# Altium schematic symbol library TI Amplifiers and Linear Special Function Amplifier.SchLib: 708 symbols (part 18 of 34) (continued)
## TAS5716PAPR (continued)
part B pins: 2 PGND_B (power) "Power ground for half-bridge B", 3 PGND_B (power) "Power ground for half-bridge B", 6 PGND_A (power) "Power ground for half-bridge A", 7 PGND_A (power) "Power ground for half-bridge A", 8 PVCC_A (power) "Power supply input for half-bridge output A", 9 PVCC_A (power) "Power supply input for half-bridge output A", 10 AVDD (power) "3.3-V analog power supply", 11 AVSS (power) "analog 3.3-V supply ground", 14 VR_ANA (power) "Internally regulated 1.8-V analog supply voltage. This terminal must not be used to power external devices.", 15 DVDD (power) "3.3-V digital power supply", 20 DVSS (power) "Digital ground", 26 DVSS (power) "Digital ground", 27 VR_DIG (power) "Internally regulated 1.8-V digital supply voltage. This terminal must not be used to power external devices.", 33 DVDD (power) "3.3-V digital power supply", 41 PVCC_D (power) "Power supply input for half-bridge output D", 42 PVCC_D (power) "Power supply input for half-bridge output D", 43 PGND_D (power) "Power ground for half-bridge D", 44 PGND_D (power) "Power ground for half-bridge D", 47 PGND_C (power) "Power ground for half-bridge C", 48 PGND_C (power) "Power ground for half-bridge C", 51 PVCC_C (power) "Power supply input for half-bridge output C", 52 PVCC_C (power) "Power supply input for half-bridge output C", 57 AGND (power) "Analog ground for power stage", 58 AVCC (power) "Analog power supply for power stage. Connect externally to same potential as PVCC.", 62 PVCC_B (power) "Power supply input for half-bridge output B", 63 PVCC_B (power) "Power supply input for half-bridge output B", 65 EP

## TAS5717PHP
designator U?
Digital Input Stereo Amplifier with Integrated CAP Free Headphone Amplifier, 0 to 85 degC, 48-pin QFP (PHP48), Green (RoHS & no Sb/Br); Manufacturer: Texas Instruments; PartNumber: TAS5717PHP; Analog Supply Max [V]: 3.6; Analog Supply Min [V]: 3; Max. Number of Speaker Outputs: 2; Power Stage Supply Min(V): 4.5; SubFamily: Mid/High-Power Amplifier; DatasheetVersion: SLOS655A; PackageVersion: 4146927/B, 08/2003; PackageReference: PHP48-4550X3600TP; PackageDescription: 48-Pin PowerPAD(TM) Plastic Quad Flatpack, Body 7 x 7 mm, Pitch 0.5 mm; Supplier 1: Digi-Key; Supplier Part Number 1: TAS5717PHP-ND; Supplier 2: Farnell; Supplier Part Number 2: 1855119; Supplier 3: Newark; Supplier Part Number 3: 23T1393; Supplier 4: Newark; Supplier Part Number 4: 21T4067; Supplier 5: Mouser; Supplier Part Number 5: 595-TAS5717PHP; Digital Supply Min [V]: 3; Eco-Plan: Green (RoHS & no Sb/Br); Input Type: Digital; Mounting Technology: Surface Mount; Code_JEDEC: MS-026; ComponentLink1Description: Manufacturer URL; ComponentLink1URL: http://www.ti.com/; ComponentLink2Description: Datasheet; ComponentLink2URL: http://www.ti.com/general/docs/lit/getliterature.tsp?genericPartNumber=TAS5717&fileType=pdf; ComponentLink3Description: Package Specification; ComponentLink3URL: http://www.ti.com/litv/pdf/mpdi001b
footprint TI-PHP48-4550X3600TP_N (QFP, 48-Leads, Body 7x7mm, Pitch 0.5mm, Thermal Pad 5.17x4.04mm, IPC Medium Density)
footprint TI-PHP48-4550X3600TP_L (QFP, 48-Leads, Body 7x7mm, Pitch 0.5mm, Thermal Pad 5.17x4.04mm, IPC High Density)
footprint TI-PHP48-4550X3600TP_M (QFP, 48-Leads, Body 7x7mm, Pitch 0.5mm, Thermal Pad 5.17x4.04mm, IPC Low Density)
part A pins: 1 HPR_IN (in) "Headphone left IN (single-ended, analog IN)", 2 HPL_OUT (out) "Headphone left OUT (single-ended, analog OUT)", 3 HPR_OUT (out) "Headphone right OUT (single-ended, analog OUT)", 4 HPL_IN (in) "Headphone right IN (single-ended, analog IN)", 6 CPN "Charge-pump flying-capacitor negative connection", 7 CPP "Charge-pump flying-capacitor positive connection", 10 PLL_FLTM "PLL negative loop-filter terminal", 11 PLL_FLTP "PLL positive loop-filter terminal", 14 ~{A_SEL} (io) "This pin is monitored on the rising edge of RESET. A value of 0 makes the I2C dev address 0x54, and a value of 1 makes it 0x56.", 15 MCLK (in) "Master clock input", 16 OSC_RES "Oscillator trim resistor. Connect an 18-kO 1% resistor to DVSSO.", 19 ~{PDN} (in) "Power down, active-low. P\D\N\ prepares the device for loss of power supplies by shutting down the noise shaper and initiating the PWM stop sequence.", 20 LRCLK (in) "Input serial audio data left/right clock (sample rate clock)", 21 SCLK (in) "Serial audio data clock (shift clock). SCLK is the serial audio port input data bit clock.", 22 SDIN (in) "Serial audio data input. SDIN supports three discrete (stereo) data formats.", 23 SDA (io) "I2C serial control data interface input/output", 24 SCL (in) "I2C serial control clock input", 25 ~{RESET} (in) "Reset, active-low. A system reset is generated by applying a logic low to this pin. R\E\S\E\T\ is an asynchronous control signal that restores the DAP to its default conditions, and places the PWM in the hard-mute (See Datasheet)", 26 STEST (in) "Factory test pin. Connect directly to DVSS.", 31 VREG "Digital regulator output. Not to be used for powering external circuitry.", 32 SSTIMER (in) "Controls ramp time of OUT_X to minimize pop. Leave this pin floating for BD mode. Requires capacitor of 2.2 nF to GND in AD mode. The capacitor determines the ramp time.", 33 ~{HP_SD} (in) "Headphone shutdown (active-low)", 36 BST_D "High-side bootstrap supply for half-bridge D", 37 OUT_D (hiz) "Output, half-bridge D", 39 OUT_C (hiz) "Output, half-bridge C", 40 BST_C "High-side bootstrap supply for half-bridge C", 41 BST_B "High-side bootstrap supply for half-bridge B", 42 OUT_B (hiz) "Output, half-bridge B", 44 OUT_A (hiz) "Output, half-bridge A", 45 BST_A "High-side bootstrap supply for half-bridge A", 47 HP_PWMR (hiz) "PWM right-channel headphone out", 48 HP_PWML (hiz) "PWM left-channel headphone out"
part B pins: 5 HPVSS (power) "Headphone ground", 8 HPVDD (power) "Headphone supply", 9 AVSS (power) "Analog 3.3-V supply ground", 12 VR_ANA (power) "Internally regulated 1.8-V analog supply voltage. This pin must not be used to power external devices.", 13 AVDD (power) "3.3-V analog power supply", 17 DVSSO (power) "Oscillator ground", 18 VR_DIG (power) "Internally regulated 1.8-V digital supply voltage. This pin must not be used to power external devices.", 27 DVDD (power) "3.3-V digital power supply", 28 DVSS (power) "Digital ground", 29 GND (power) "Analog ground for power stage", 30 AGND (power) "Analog ground for power stage", 34 GVDD_OUT (power) "Gate drive internal regulator output", 35 PVDD_CD (power) "Power-supply input for half-bridge output C", 38 PGND_CD (power) "Power ground for half-bridges C and D", 43 PGND_AB (power) "Power ground for half-bridges A and B", 46 PVDD_AB (power) "Power-supply input for half-bridge output A", 49 EP

## TAS5717PHPR
designator U?
Digital Input Stereo Amplifier with Integrated CAP Free Headphone Amplifier, 0 to 85 degC, 48-pin QFP (PHP48), Green (RoHS & no Sb/Br); Manufacturer: Texas Instruments; PartNumber: TAS5717PHPR; Analog Supply Max [V]: 3.6; Analog Supply Min [V]: 3; Max. Number of Speaker Outputs: 2; Power Stage Supply Min(V): 4.5; SubFamily: Mid/High-Power Amplifier; DatasheetVersion: SLOS655A; PackageVersion: 4146927/B, 08/2003; PackageReference: PHP48-4550X3600TP; PackageDescription: 48-Pin PowerPAD(TM) Plastic Quad Flatpack, Body 7 x 7 mm, Pitch 0.5 mm; Supplier 1: Digi-Key; Supplier Part Number 1: 296-28062-2-ND; Supplier 2: Digi-Key; Supplier Part Number 2: 296-28062-1-ND; Supplier 3: Digi-Key; Supplier Part Number 3: 296-28062-6-ND; Supplier 4: Farnell; Supplier Part Number 4: 1854555; Supplier 5: Newark; Supplier Part Number 5: 13T8922; Supplier 6: Mouser; Supplier Part Number 6: 595-TAS5717PHPR; Digital Supply Min [V]: 3; Eco-Plan: Green (RoHS & no Sb/Br); Input Type: Digital; Mounting Technology: Surface Mount; Code_JEDEC: MS-026; ComponentLink1Description: Manufacturer URL; ComponentLink1URL: http://www.ti.com/; ComponentLink2Description: Datasheet; ComponentLink2URL: http://www.ti.com/general/docs/lit/getliterature.tsp?genericPartNumber=TAS5717&fileType=pdf; ComponentLink3Description: Package Specification; ComponentLink3URL: http://www.ti.com/litv/pdf/mpdi001b
footprint TI-PHP48-4550X3600TP_N (QFP, 48-Leads, Body 7x7mm, Pitch 0.5mm, Thermal Pad 5.17x4.04mm, IPC Medium Density)
footprint TI-PHP48-4550X3600TP_L (QFP, 48-Leads, Body 7x7mm, Pitch 0.5mm, Thermal Pad 5.17x4.04mm, IPC High Density)
footprint TI-PHP48-4550X3600TP_M (QFP, 48-Leads, Body 7x7mm, Pitch 0.5mm, Thermal Pad 5.17x4.04mm, IPC Low Density)
part A pins: 1 HPR_IN (in) "Headphone left IN (single-ended, analog IN)", 2 HPL_OUT (out) "Headphone left OUT (single-ended, analog OUT)", 3 HPR_OUT (out) "Headphone right OUT (single-ended, analog OUT)", 4 HPL_IN (in) "Headphone right IN (single-ended, analog IN)", 6 CPN "Charge-pump flying-capacitor negative connection", 7 CPP "Charge-pump flying-capacitor positive connection", 10 PLL_FLTM "PLL negative loop-filter terminal", 11 PLL_FLTP "PLL positive loop-filter terminal", 14 ~{A_SEL} (io) "This pin is monitored on the rising edge of RESET. A value of 0 makes the I2C dev address 0x54, and a value of 1 makes it 0x56.", 15 MCLK (in) "Master clock input", 16 OSC_RES "Oscillator trim resistor. Connect an 18-kO 1% resistor to DVSSO.", 19 ~{PDN} (in) "Power down, active-low. P\D\N\ prepares the device for loss of power supplies by shutting down the noise shaper and initiating the PWM stop sequence.", 20 LRCLK (in) "Input serial audio data left/right clock (sample rate clock)", 21 SCLK (in) "Serial audio data clock (shift clock). SCLK is the serial audio port input data bit clock.", 22 SDIN (in) "Serial audio data input. SDIN supports three discrete (stereo) data formats.", 23 SDA (io) "I2C serial control data interface input/output", 24 SCL (in) "I2C serial control clock input", 25 ~{RESET} (in) "Reset, active-low. A system reset is generated by applying a logic low to this pin. R\E\S\E\T\ is an asynchronous control signal that restores the DAP to its default conditions, and places the PWM in the hard-mute (See Datasheet)", 26 STEST (in) "Factory test pin. Connect directly to DVSS.", 31 VREG "Digital regulator output. Not to be used for powering external circuitry.", 32 SSTIMER (in) "Controls ramp time of OUT_X to minimize pop. Leave this pin floating for BD mode. Requires capacitor of 2.2 nF to GND in AD mode. The capacitor determines the ramp time.", 33 ~{HP_SD} (in) "Headphone shutdown (active-low)", 36 BST_D "High-side bootstrap supply for half-bridge D", 37 OUT_D (hiz) "Output, half-bridge D", 39 OUT_C (hiz) "Output, half-bridge C", 40 BST_C "High-side bootstrap supply for half-bridge C", 41 BST_B "High-side bootstrap supply for half-bridge B", 42 OUT_B (hiz) "Output, half-bridge B", 44 OUT_A (hiz) "Output, half-bridge A", 45 BST_A "High-side bootstrap supply for half-bridge A", 47 HP_PWMR (hiz) "PWM right-channel headphone out", 48 HP_PWML (hiz) "PWM left-channel headphone out"
part B pins: 5 HPVSS (power) "Headphone ground", 8 HPVDD (power) "Headphone supply", 9 AVSS (power) "Analog 3.3-V supply ground", 12 VR_ANA (power) "Internally regulated 1.8-V analog supply voltage. This pin must not be used to power external devices.", 13 AVDD (power) "3.3-V analog power supply", 17 DVSSO (power) "Oscillator ground", 18 VR_DIG (power) "Internally regulated 1.8-V digital supply voltage. This pin must not be used to power external devices.", 27 DVDD (power) "3.3-V digital power supply", 28 DVSS (power) "Digital ground", 29 GND (power) "Analog ground for power stage", 30 AGND (power) "Analog ground for power stage", 34 GVDD_OUT (power) "Gate drive internal regulator output", 35 PVDD_CD (power) "Power-supply input for half-bridge output C", 38 PGND_CD (power) "Power ground for half-bridges C and D", 43 PGND_AB (power) "Power ground for half-bridges A and B", 46 PVDD_AB (power) "Power-supply input for half-bridge output A", 49 EP

## TAS5719PHP
designator U?
Digital Input Stereo Amplifier with Integrated CAP Free Headphone Amplifier, 0 to 85 degC, 48-pin QFP (PHP48), Green (RoHS & no Sb/Br); Manufacturer: Texas Instruments; PartNumber: TAS5719PHP; Analog Supply Max [V]: 3.6; Analog Supply Min [V]: 3; Max. Number of Speaker Outputs: 2; Power Stage Supply Min(V): 4.5; SubFamily: Mid/High-Power Amplifier; DatasheetVersion: SLOS655A; PackageVersion: 4146927/B, 08/2003; PackageReference: PHP48-4550X3600TP; PackageDescription: 48-Pin PowerPAD(TM) Plastic Quad Flatpack, Body 7 x 7 mm, Pitch 0.5 mm; Supplier 1: Digi-Key; Supplier Part Number 1: 296-36735-ND; Supplier 2: Mouser; Supplier Part Number 2: 595-TAS5719PHP; Digital Supply Min [V]: 3; Eco-Plan: Green (RoHS & no Sb/Br); Input Type: Digital; Mounting Technology: Surface Mount; Code_JEDEC: MS-026; ComponentLink1Description: Manufacturer URL; ComponentLink1URL: http://www.ti.com/; ComponentLink2Description: Datasheet; ComponentLink2URL: http://www.ti.com/general/docs/lit/getliterature.tsp?genericPartNumber=TAS5719&fileType=pdf; ComponentLink3Description: Package Specification; ComponentLink3URL: http://www.ti.com/litv/pdf/mpdi001b
footprint TI-PHP48-4550X3600TP_N (QFP, 48-Leads, Body 7x7mm, Pitch 0.5mm, Thermal Pad 5.17x4.04mm, IPC Medium Density)
footprint TI-PHP48-4550X3600TP_L (QFP, 48-Leads, Body 7x7mm, Pitch 0.5mm, Thermal Pad 5.17x4.04mm, IPC High Density)
footprint TI-PHP48-4550X3600TP_M (QFP, 48-Leads, Body 7x7mm, Pitch 0.5mm, Thermal Pad 5.17x4.04mm, IPC Low Density)
part A pins: 1 HPR_IN (in) "Headphone left IN (single-ended, analog IN)", 2 HPL_OUT (out) "Headphone left OUT (single-ended, analog OUT)", 3 HPR_OUT (out) "Headphone right OUT (single-ended, analog OUT)", 4 HPL_IN (in) "Headphone right IN (single-ended, analog IN)", 6 CPN "Charge-pump flying-capacitor negative connection", 7 CPP "Charge-pump flying-capacitor positive connection", 10 PLL_FLTM "PLL negative loop-filter terminal", 11 PLL_FLTP "PLL positive loop-filter terminal", 14 ~{A_SEL} (io) "This pin is monitored on the rising edge of RESET. A value of 0 makes the I2C dev address 0x54, and a value of 1 makes it 0x56.", 15 MCLK (in) "Master clock input", 16 OSC_RES "Oscillator trim resistor. Connect an 18-kO 1% resistor to DVSSO.", 19 ~{PDN} (in) "Power down, active-low. P\D\N\ prepares the device for loss of power supplies by shutting down the noise shaper and initiating the PWM stop sequence.", 20 LRCLK (in) "Input serial audio data left/right clock (sample rate clock)", 21 SCLK (in) "Serial audio data clock (shift clock). SCLK is the serial audio port input data bit clock.", 22 SDIN (in) "Serial audio data input. SDIN supports three discrete (stereo) data formats.", 23 SDA (io) "I2C serial control data interface input/output", 24 SCL (in) "I2C serial control clock input", 25 ~{RESET} (in) "Reset, active-low. A system reset is generated by applying a logic low to this pin. R\E\S\E\T\ is an asynchronous control signal that restores the DAP to its default conditions, and places the PWM in the hard-mute (See Datasheet)", 26 STEST (in) "Factory test pin. Connect directly to DVSS.", 31 VREG "Digital regulator output. Not to be used for powering external circuitry.", 32 SSTIMER (in) "Controls ramp time of OUT_X to minimize pop. Leave this pin floating for BD mode. Requires capacitor of 2.2 nF to GND in AD mode. The capacitor determines the ramp time.", 33 ~{HP_SD} (in) "Headphone shutdown (active-low)", 36 BST_D "High-side bootstrap supply for half-bridge D", 37 OUT_D (hiz) "Output, half-bridge D", 39 OUT_C (hiz) "Output, half-bridge C", 40 BST_C "High-side bootstrap supply for half-bridge C", 41 BST_B "High-side bootstrap supply for half-bridge B", 42 OUT_B (hiz) "Output, half-bridge B", 44 OUT_A (hiz) "Output, half-bridge A", 45 BST_A "High-side bootstrap supply for half-bridge A", 47 HP_PWMR (hiz) "PWM right-channel headphone out", 48 HP_PWML (hiz) "PWM left-channel headphone out"
part B pins: 5 HPVSS (power) "Headphone ground", 8 HPVDD (power) "Headphone supply", 9 AVSS (power) "Analog 3.3-V supply ground", 12 VR_ANA (power) "Internally regulated 1.8-V analog supply voltage. This pin must not be used to power external devices.", 13 AVDD (power) "3.3-V analog power supply", 17 DVSSO (power) "Oscillator ground", 18 VR_DIG (power) "Internally regulated 1.8-V digital supply voltage. This pin must not be used to power external devices.", 27 DVDD (power) "3.3-V digital power supply", 28 DVSS (power) "Digital ground", 29 GND (power) "Analog ground for power stage", 30 AGND (power) "Analog ground for power stage", 34 GVDD_OUT (power) "Gate drive internal regulator output", 35 PVDD_CD (power) "Power-supply input for half-bridge output C", 38 PGND_CD (power) "Power ground for half-bridges C and D", 43 PGND_AB (power) "Power ground for half-bridges A and B", 46 PVDD_AB (power) "Power-supply input for half-bridge output A", 49 EP

## TAS5727PHP
designator U?
25 W Digital Audio Power Amplifier with EQ and 2-Band DRC, 0 to 85 degC, 48-pin QFP (PHP48), Green (RoHS & no Sb/Br); Manufacturer: Texas Instruments; PartNumber: TAS5727PHP; Analog Supply Max [V]: 3.6; Analog Supply Min [V]: 3; Power Stage Supply Min(V): 8; SubFamily: Mid/High-Power Amplifier; DatasheetVersion: SLOS670; PackageVersion: 4146927/B, 08/2003; PackageReference: PHP48-4550X3600TP; PackageDescription: 48-Pin PowerPAD(TM) Plastic Quad Flatpack, Body 7 x 7 mm, Pitch 0.5 mm; Supplier 1: Digi-Key; Supplier Part Number 1: 296-32736-ND; Supplier 2: Farnell; Supplier Part Number 2: 1882265; Supplier 3: Newark; Supplier Part Number 3: 32T3258; Supplier 4: Mouser; Supplier Part Number 4: 595-TAS5727PHP; Digital Supply Min [V]: 3; Eco-Plan: Green (RoHS & no Sb/Br); Input Type: Digital; Mounting Technology: Surface Mount; Code_JEDEC: MS-026; ComponentLink1Description: Manufacturer URL; ComponentLink1URL: http://www.ti.com/; ComponentLink2Description: Datasheet; ComponentLink2URL: http://www.ti.com/general/docs/lit/getliterature.tsp?genericPartNumber=TAS5727A&fileType=pdf; ComponentLink3Description: Package Specification; ComponentLink3URL: http://www.ti.com/litv/pdf/mpdi001b
footprint TI-PHP48-4550X3600TP_N (QFP, 48-Leads, Body 7x7mm, Pitch 0.5mm, Thermal Pad 5.17x4.04mm, IPC Medium Density)
footprint TI-PHP48-4550X3600TP_L (QFP, 48-Leads, Body 7x7mm, Pitch 0.5mm, Thermal Pad 5.17x4.04mm, IPC High Density)
footprint TI-PHP48-4550X3600TP_M (QFP, 48-Leads, Body 7x7mm, Pitch 0.5mm, Thermal Pad 5.17x4.04mm, IPC Low Density)
part A pins: 1 OUT_A (hiz) "Output, half-bridge A", 4 BST_A "High-side bootstrap supply for half-bridge A", 6 SSTIMER (in) "Controls ramp time of OUT_x to minimize pop. Leave this pin floating for BD mode. Requires capacitor of 2.2 nF to GND in AD mode. The capacitor determines the ramp time.", 8 PBTL (in) "Low means BTL mode; high means PBTL mode. Information goes directly to power stage.", 10 PLL_FLTM "PLL negative loop-filter terminal", 11 PLL_FLTP "PLL positive loop-filter terminal", 14 A_SEL_~{FAULT} (io) "This pin is monitored on the rising edge of R\E\S\E\T\.A value of 0 (15-kohm pulldown) sets the I2C device address 0x54 and a value of 1 (15-kohm pullup) sets it 0x56.this dual-function pin can be programmed to output (See Datasheet)", 15 MCLK (in) "Master clock input", 16 OSC_RES "Oscillator trim resistor. Connect an 18.2-kohm, 1% resistor to DVSSO.", 19 ~{PDN} (in) "Power down, active-low. P\D\N\ prepares the device for loss of power supplies by shutting down the noise shaper and initiating the PWM stop sequence.", 20 LRCLK (in) "Input serial audio data left/right clock (sample-rate clock)", 21 SCLK (in) "Serial audio-data clock (shift clock). SCLK is the serial-audio-port input-data bit clock.", 22 SDIN (in) "Serial audio data input. SDIN supports three discrete (stereo) data formats.", 23 SDA (io) "I2C serial control data interface input/output", 24 SCL (in) "I2C serial control clock input", 25 ~{RESET} (in) "Reset, active-low. A system reset is generated by applying a logic low to this pin. R\E\S\E\T\ is an asynchronous control signal that restores the DAP to its default conditions and places the PWM in the hard-mute (See Datasheet)", 26 STEST (in) "Factory test pin. Connect directly to DVSS.", 31 VREG "Digital regulator output. Not to be used for powering external circuitry.", 33 BST_D "High-side bootstrap supply for half-bridge D", 36 OUT_D (hiz) "Output, half-bridge D", 39 OUT_C (hiz) "Output, half-bridge C", 42 BST_C "High-side bootstrap supply for half-bridge C", 43 BST_B "High-side bootstrap supply for half-bridge B", 46 OUT_B (hiz) "Output, half-bridge B"
part B pins: 2 PVDD_AB (power) "Power-supply input for half-bridge output A", 3 PVDD_AB (power) "Power-supply input for half-bridge output A", 9 AVSS (power) "Analog 3.3-V supply ground", 12 VR_ANA (power) "Internally regulated 1.8-V analog supply voltage. This pin must not be used to power external devices.", 13 AVDD (power) "3.3-V analog power supply", 17 DVSSO (power) "Oscillator ground", 18 VR_DIG (power) "Internally regulated 1.8-V digital supply voltage. This pin must not be used to power external devices.", 27 DVDD (power) "3.3-V digital power supply", 28 DVSS (power) "Digital ground", 29 GND (power) "Analog ground for power stage", 30 AGND (power) "Local analog ground for power stage", 32 GVDD_OUT (power) "Gate drive internal regulator output", 34 PVDD_CD (power) "Power-supply input for half-bridge output D", 35 PVDD_CD (power) "Power-supply input for half-bridge output D", 37 PGND_CD (power) "Power ground for half-bridges C and D", 38 PGND_CD (power) "Power ground for half-bridges C and D", 47 PGND_AB (power) "Power ground for half-bridges A and B", 48 PGND_AB (power) "Power ground for half-bridges A and B", 49 EP
part C pins: 5 NC "No connect", 7 NC "No connect", 40 NC "No connect", 41 NC "No connect", 44 NC "No connect", 45 NC "No connect"

## TAS5727PHPR
designator U?
25 W Digital Audio Power Amplifier with EQ and 2-Band DRC, 0 to 85 degC, 48-pin QFP (PHP48), Green (RoHS & no Sb/Br); Manufacturer: Texas Instruments; PartNumber: TAS5727PHPR; Analog Supply Max [V]: 3.6; Analog Supply Min [V]: 3; Power Stage Supply Min(V): 8; SubFamily: Mid/High-Power Amplifier; DatasheetVersion: SLOS670; PackageVersion: 4146927/B, 08/2003; PackageReference: PHP48-4550X3600TP; PackageDescription: 48-Pin PowerPAD(TM) Plastic Quad Flatpack, Body 7 x 7 mm, Pitch 0.5 mm; Supplier 1: Digi-Key; Supplier Part Number 1: 296-28257-2-ND; Supplier 2: Digi-Key; Supplier Part Number 2: 296-28257-1-ND; Supplier 3: Digi-Key; Supplier Part Number 3: 296-28257-6-ND; Supplier 4: Newark; Supplier Part Number 4: 32T2368; Supplier 5: Mouser; Supplier Part Number 5: 595-TAS5727PHPR; Digital Supply Min [V]: 3; Eco-Plan: Green (RoHS & no Sb/Br); Input Type: Digital; Mounting Technology: Surface Mount; Code_JEDEC: MS-026; ComponentLink1Description: Manufacturer URL; ComponentLink1URL: http://www.ti.com/; ComponentLink2Description: Datasheet; ComponentLink2URL: http://www.ti.com/general/docs/lit/getliterature.tsp?genericPartNumber=TAS5727A&fileType=pdf; ComponentLink3Description: Package Specification; ComponentLink3URL: http://www.ti.com/litv/pdf/mpdi001b
footprint TI-PHP48-4550X3600TP_N (QFP, 48-Leads, Body 7x7mm, Pitch 0.5mm, Thermal Pad 5.17x4.04mm, IPC Medium Density)
footprint TI-PHP48-4550X3600TP_L (QFP, 48-Leads, Body 7x7mm, Pitch 0.5mm, Thermal Pad 5.17x4.04mm, IPC High Density)
footprint TI-PHP48-4550X3600TP_M (QFP, 48-Leads, Body 7x7mm, Pitch 0.5mm, Thermal Pad 5.17x4.04mm, IPC Low Density)
part A pins: 1 OUT_A (hiz) "Output, half-bridge A", 4 BST_A "High-side bootstrap supply for half-bridge A", 6 SSTIMER (in) "Controls ramp time of OUT_x to minimize pop. Leave this pin floating for BD mode. Requires capacitor of 2.2 nF to GND in AD mode. The capacitor determines the ramp time.", 8 PBTL (in) "Low means BTL mode; high means PBTL mode. Information goes directly to power stage.", 10 PLL_FLTM "PLL negative loop-filter terminal", 11 PLL_FLTP "PLL positive loop-filter terminal", 14 A_SEL_~{FAULT} (io) "This pin is monitored on the rising edge of R\E\S\E\T\.A value of 0 (15-kohm pulldown) sets the I2C device address 0x54 and a value of 1 (15-kohm pullup) sets it 0x56.this dual-function pin can be programmed to output (See Datasheet)", 15 MCLK (in) "Master clock input", 16 OSC_RES "Oscillator trim resistor. Connect an 18.2-kohm, 1% resistor to DVSSO.", 19 ~{PDN} (in) "Power down, active-low. P\D\N\ prepares the device for loss of power supplies by shutting down the noise shaper and initiating the PWM stop sequence.", 20 LRCLK (in) "Input serial audio data left/right clock (sample-rate clock)", 21 SCLK (in) "Serial audio-data clock (shift clock). SCLK is the serial-audio-port input-data bit clock.", 22 SDIN (in) "Serial audio data input. SDIN supports three discrete (stereo) data formats.", 23 SDA (io) "I2C serial control data interface input/output", 24 SCL (in) "I2C serial control clock input", 25 ~{RESET} (in) "Reset, active-low. A system reset is generated by applying a logic low to this pin. R\E\S\E\T\ is an asynchronous control signal that restores the DAP to its default conditions and places the PWM in the hard-mute (See Datasheet)", 26 STEST (in) "Factory test pin. Connect directly to DVSS.", 31 VREG "Digital regulator output. Not to be used for powering external circuitry.", 33 BST_D "High-side bootstrap supply for half-bridge D", 36 OUT_D (hiz) "Output, half-bridge D", 39 OUT_C (hiz) "Output, half-bridge C", 42 BST_C "High-side bootstrap supply for half-bridge C", 43 BST_B "High-side bootstrap supply for half-bridge B", 46 OUT_B (hiz) "Output, half-bridge B"
part B pins: 2 PVDD_AB (power) "Power-supply input for half-bridge output A", 3 PVDD_AB (power) "Power-supply input for half-bridge output A", 9 AVSS (power) "Analog 3.3-V supply ground", 12 VR_ANA (power) "Internally regulated 1.8-V analog supply voltage. This pin must not be used to power external devices.", 13 AVDD (power) "3.3-V analog power supply", 17 DVSSO (power) "Oscillator ground", 18 VR_DIG (power) "Internally regulated 1.8-V digital supply voltage. This pin must not be used to power external devices.", 27 DVDD (power) "3.3-V digital power supply", 28 DVSS (power) "Digital ground", 29 GND (power) "Analog ground for power stage", 30 AGND (power) "Local analog ground for power stage", 32 GVDD_OUT (power) "Gate drive internal regulator output", 34 PVDD_CD (power) "Power-supply input for half-bridge output D", 35 PVDD_CD (power) "Power-supply input for half-bridge output D", 37 PGND_CD (power) "Power ground for half-bridges C and D", 38 PGND_CD (power) "Power ground for half-bridges C and D", 47 PGND_AB (power) "Power ground for half-bridges A and B", 48 PGND_AB (power) "Power ground for half-bridges A and B", 49 EP
part C pins: 5 NC "No connect", 7 NC "No connect", 40 NC "No connect", 41 NC "No connect", 44 NC "No connect", 45 NC "No connect"

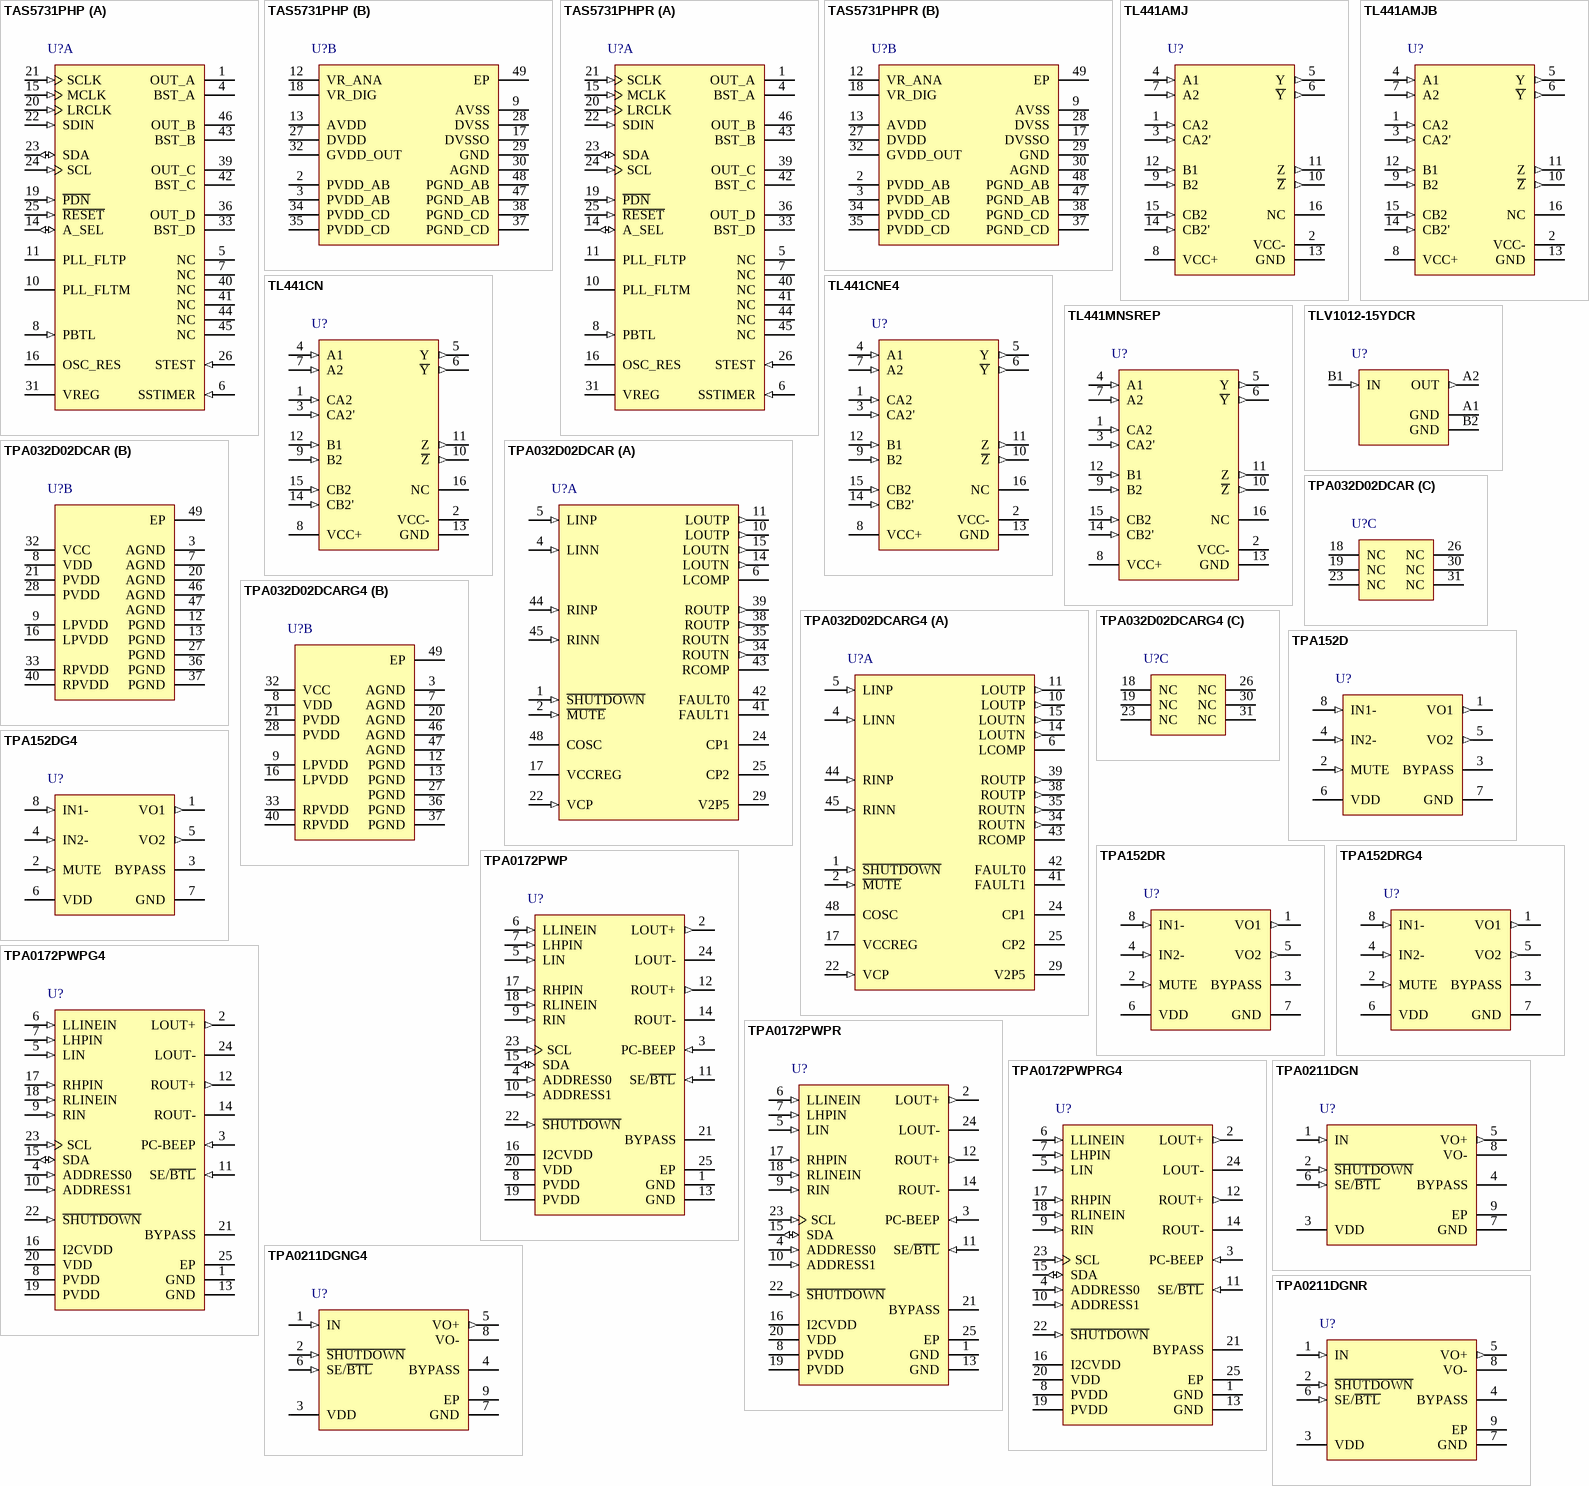
[diagram p23: symbols TAS5731PHP to TPA0211DGNR]

## TAS5731PHP
designator U?
20 W Stereo (2.1) Class-D Audio Amplifier with Audio Processing, 0 to 85 degC, 48-pin QFP (PHP48), Green (RoHS & no Sb/Br); Manufacturer: Texas Instruments; PartNumber: TAS5731PHP; Analog Supply Max [V]: 3.6; Analog Supply Min [V]: 3; Input Type: Digital; Power Stage Supply Min(V): 8; SubFamily: Mid/High-Power Amplifier; DatasheetVersion: SLOS726; PackageVersion: 4146927/B, 08/2003; PackageReference: PHP48-4550X3600TP; PackageDescription: 48-Pin PowerPAD(TM) Plastic Quad Flatpack, Body 7 x 7 mm, Pitch 0.5 mm; Supplier 1: Digi-Key; Supplier Part Number 1: 296-34191-5-ND; Supplier 2: Farnell; Supplier Part Number 2: 2097124; Supplier 3: Newark; Supplier Part Number 3: 76T8032; Supplier 4: Mouser; Supplier Part Number 4: 595-TAS5731PHP; Eco-Plan: Green (RoHS & no Sb/Br); Mounting Technology: Surface Mount; Code_JEDEC: MS-026; ComponentLink1Description: Manufacturer URL; ComponentLink1URL: http://www.ti.com/; ComponentLink2Description: Datasheet; ComponentLink2URL: http://www.ti.com/general/docs/lit/getliterature.tsp?genericPartNumber=TAS5731&fileType=pdf; ComponentLink3Description: Package Specification; ComponentLink3URL: http://www.ti.com/litv/pdf/mpdi001b
footprint TI-PHP48-4550X3600TP_N (QFP, 48-Leads, Body 7x7mm, Pitch 0.5mm, Thermal Pad 5.17x4.04mm, IPC Medium Density)
footprint TI-PHP48-4550X3600TP_L (QFP, 48-Leads, Body 7x7mm, Pitch 0.5mm, Thermal Pad 5.17x4.04mm, IPC High Density)
footprint TI-PHP48-4550X3600TP_M (QFP, 48-Leads, Body 7x7mm, Pitch 0.5mm, Thermal Pad 5.17x4.04mm, IPC Low Density)
part A pins: 1 OUT_A (hiz) "Output, half-bridge A", 4 BST_A "High-side bootstrap supply for half-bridge A", 5 NC "No connect", 6 SSTIMER (in) "Controls ramp time of OUT_x to minimize pop. Leave this pin floating for BD mode. Requires capacitor of 2.2 nF to GND in AD mode. The capacitor determines the ramp time.", 7 NC "No connect", 8 PBTL (in) "Low means BTL mode; high means PBTL mode. Information goes directly to power stage.", 10 PLL_FLTM "PLL negative loop-filter terminal", 11 PLL_FLTP "PLL positive loop-filter terminal", 14 A_SEL (io) "A value of 0 (15-kohm pulldown) makes the I2C device address 0x34,and a value of 1 (15-kohm pullup) makes it 0x36.", 15 MCLK (in) "Master clock input", 16 OSC_RES "Oscillator trim resistor. Connect an 18.2-kohm, 1% resistor to DVSSO.", 19 ~{PDN} (in) "Power down, active-low. P\D\N\ prepares the device for loss of power supplies by shutting down the noise shaper and initiating the PWM stop sequence.", 20 LRCLK (in) "Input serial audio data left/right clock (sample-rate clock)", 21 SCLK (in) "Serial audio-data clock (shift clock). SCLK is the serial-audio-port input-data bit clock.", 22 SDIN (in) "Serial audio data input. SDIN supports three discrete (stereo) data formats.", 23 SDA (io) "I2C serial control data interface input/output", 24 SCL (in) "I2C serial control clock input", 25 ~{RESET} (in) "Reset, active-low. A system reset is generated by applying a logic low to this pin. R\E\S\E\T\ is an asynchronous control signal that restores the DAP to its default conditions and places the PWM in the hard-mute (See Datasheet)", 26 STEST (in) "Factory test pin. Connect directly to DVSS.", 31 VREG "Digital regulator output. Not to be used for powering external circuitry.", 33 BST_D "High-side bootstrap supply for half-bridge D", 36 OUT_D (hiz) "Output, half-bridge D", 39 OUT_C (hiz) "Output, half-bridge C", 40 NC "No connect", 41 NC "No connect", 42 BST_C "High-side bootstrap supply for half-bridge C", 43 BST_B "High-side bootstrap supply for half-bridge B", 44 NC "No connect", 45 NC "No connect", 46 OUT_B (hiz) "Output, half-bridge B"
part B pins: 2 PVDD_AB (power) "Power-supply input for half-bridge output A", 3 PVDD_AB (power) "Power-supply input for half-bridge output A", 9 AVSS (power) "Analog 3.3-V supply ground", 12 VR_ANA (power) "Internally regulated 1.8-V analog supply voltage. This pin must not be used to power external devices.", 13 AVDD (power) "3.3-V analog power supply", 17 DVSSO (power) "Oscillator ground", 18 VR_DIG (power) "Internally regulated 1.8-V digital supply voltage. This pin must not be used to power external devices.", 27 DVDD (power) "3.3-V digital power supply", 28 DVSS (power) "Digital ground", 29 GND (power) "Analog ground for power stage", 30 AGND (power) "Local analog ground for power stage", 32 GVDD_OUT (power) "Gate drive internal regulator output", 34 PVDD_CD (power) "Power-supply input for half-bridge output D", 35 PVDD_CD (power) "Power-supply input for half-bridge output D", 37 PGND_CD (power) "Power ground for half-bridges C and D", 38 PGND_CD (power) "Power ground for half-bridges C and D", 47 PGND_AB (power) "Power ground for half-bridges A and B", 48 PGND_AB (power) "Power ground for half-bridges A and B", 49 EP